# Altium footprint library ERNI THD.PcbLib: 27 footprints (part 1 of 3) (continued)
## ERNI_214363 [mm] "Pre-Alignement Guide Pin With Socket for Coding Keys and Base-Plate, Washer and Nut M4"
height 24
pads (2):
  round 5 / inner round 5 / far side round 8 hole 4.3: 1(0,0)
  round 1 hole 2.5 unplated mask+0.75: MECH(8.5,0)
Top Overlay:
  lines w0.2: -4.5,0 cw(c0,0) -4.229,1.539 ; -4.229,-1.539 ccw(c0,0) -3.447,-2.893 ; -3.447,2.893 cw(c0,0) -2.25,3.897 ; -2.25,-3.897 ccw(c0,0) -0.781,-4.432 ; -0.781,4.432 cw(c0,0) 0.781,4.432 ; 0.781,-4.432 ccw(c0,0) 2.25,-3.897 ; 2.25,3.897 cw(c0,0) 3.447,2.893 ; 3.447,-2.893 ccw(c0,0) 4.229,-1.539 ; 4.229,1.539 cw(c0,0) 4.5,0 ; 6.944,-0.55 5.95,-0.55 5.95,0.55 6.944,0.55 ; -0.995,-4.9 cw(c0,0) -0.995,4.9 0.995,4.9 cw(c0,0) 2.575,4.286 ccw(c3.606,6) 3.606,4 12.45,4 cw(c12.45,3) 13.45,3 13.45,-3 cw(c12.45,-3) 12.45,-4 3.606,-4 ccw(c3.606,-6) 2.575,-4.286 cw(c0,0) 0.995,-4.9 -0.995,-4.9 ; 4.55,-1.125 4.9,-1.731 4.9,-2.925 12.1,-2.925 12.1,-1.731 12.45,-1.125 12.45,1.125 12.1,1.731 12.1,2.925 4.9,2.925 4.9,1.731 4.55,1.125 4.55,-1.125 ; 4.9,-2.825 6.3,-2.825 6.3,-1.6 4.9,-1.6 4.9,-2.825 ; 4.9,1.6 6.3,1.6 6.3,2.825 4.9,2.825 4.9,1.6 ; 10.7,-2.825 12.1,-2.825 12.1,-1.6 10.7,-1.6 10.7,-2.825 ; 10.7,1.6 12.1,1.6 12.1,2.825 10.7,2.825 10.7,1.6
Mechanical 8:
  lines w0.1: -0.5,0 0,0 ; 0,-0.5 0,0 ; 0,0.5 0,0 ; 0.5,0 0,0 ; 8,0 8.5,0 ; 8.5,-0.5 8.5,0 ; 8.5,0.5 8.5,0 ; 9,0 8.5,0 ; 10.5,-4 10.5,0 10.5,4
  text "Comp Side" at 9.825,-4.432 h1
Mechanical 14:
  circle w0.1: c0,0 r3.05
  circle w0.1: c0,0 r2.5
  lines w0.1: -4.5,0 cw(c0,0) -4.229,1.539 ; -4.229,-1.539 ccw(c0,0) -3.447,-2.893 ; -3.447,2.893 cw(c0,0) -2.25,3.897 ; -2.25,-3.897 ccw(c0,0) -0.781,-4.432 ; -0.781,4.432 cw(c0,0) 0.781,4.432 ; 0.781,-4.432 ccw(c0,0) 2.25,-3.897 ; 2.25,3.897 cw(c0,0) 3.447,2.893 ; 3.447,-2.893 ccw(c0,0) 4.229,-1.539 ; 4.229,1.539 cw(c0,0) 4.5,0 ; -2.267,-3.05 cw(c0,0) -2.267,3.05 2.267,3.05 cw(c0,0) 2.267,-3.05 -2.267,-3.05 ; -0.995,-4.9 cw(c0,0) -0.995,4.9 0.995,4.9 cw(c0,0) 2.575,4.286 ccw(c3.606,6) 3.606,4 12.45,4 cw(c12.45,3) 13.45,3 13.45,-3 cw(c12.45,-3) 12.45,-4 3.606,-4 ccw(c3.606,-6) 2.575,-4.286 cw(c0,0) 0.995,-4.9 -0.995,-4.9 ; 4.55,-1.125 4.9,-1.731 4.9,-2.925 12.1,-2.925 12.1,-1.731 12.45,-1.125 12.45,1.125 12.1,1.731 12.1,2.925 4.9,2.925 4.9,1.731 4.55,1.125 4.55,-1.125 ; 4.9,-2.825 6.3,-2.825 6.3,-1.6 4.9,-1.6 4.9,-2.825 ; 4.9,1.6 6.3,1.6 6.3,2.825 4.9,2.825 4.9,1.6 ; 5.95,-0.55 7.05,-0.55 7.05,0.55 5.95,0.55 5.95,-0.55 ; 10.7,-2.825 12.1,-2.825 12.1,-1.6 10.7,-1.6 10.7,-2.825 ; 10.7,1.6 12.1,1.6 12.1,2.825 10.7,2.825 10.7,1.6
3D body "ERNI_214363_Part2.stp": height -1.6, standoff -4.3, extent -3.75,-4.041 3.75,4.042
3D body "ERNI_214363_Part1.stp": height 24, standoff -8, extent -5,-4.9 13.45,4.9

## ERNI_214443 [mm] "40+4 Contacts, 5 Rows  (a,b,c,d,e) of 8 positions + 1 Shield Row (f) of  4 Positions, Pitch 2 mm,  Press-Fit, Right Angle Ermet B8 CompactPCI Express Female Connector"
height 11.4
pads (44):
  round 1.1 hole 0.6: a1(4,7) a2(4,5) a3(4,3) a4(4,1) a5(4,-1) a6(4,-3) a7(4,-5) a8(4,-7) b1(2,7) b2(2,5) b3(2,3) b4(2,1) b5(2,-1) b6(2,-3) b7(2,-5) b8(2,-7) c1(0,7) c2(0,5) c3(0,3) c4(0,1) c5(0,-1) c6(0,-3) c7(0,-5) c8(0,-7) d1(-2,7) d2(-2,5) d3(-2,3) d4(-2,1) d5(-2,-1) d6(-2,-3) d7(-2,-5) d8(-2,-7) e1(-4,7) e2(-4,5) e3(-4,3) e4(-4,1) e5(-4,-1) e6(-4,-3) e7(-4,-5) e8(-4,-7) f1(-6,7) f3(-6,3) f5(-6,-1) f7(-6,-5)
Top Overlay:
  lines w0.2: -6.109,-5.944 -6.109,-7.915 -4.515,-7.915 ; -6.109,-4.056 -6.109,-1.944 ; -6.109,-0.056 -6.109,2.056 ; -6.109,3.944 -6.109,6.056 ; -5.849,-7.915 -5.849,-8 14.801,-8 14.801,8 -5.849,8 -5.849,7.915 ; -5.744,7.915 -4.515,7.915 ; -5.689,-7.915 -5.689,-5.898 ; -5.689,-4.102 -5.689,-1.898 ; -5.689,-0.102 -5.689,2.102 ; -5.689,3.898 -5.689,6.102 ; -5.689,7.898 -5.689,7.915 ; 4.515,-7.915 13.601,-7.915 13.601,-6.365 cw(c13.751,-6.365) 13.738,-6.216 14.218,-6.215 14.218,-5.715 13.751,-5.715 cw(c13.751,-5.565) 13.601,-5.565 13.601,-0.365 cw(c13.751,-0.365) 13.751,-0.215 14.218,-0.215 14.218,0.285 13.751,0.285 cw(c13.751,0.435) 13.601,0.435 13.601,5.635 cw(c13.751,5.635) 13.751,5.785 14.218,5.785 14.218,6.285 13.751,6.285 cw(c13.751,6.435) 13.601,6.435 13.601,7.915 4.515,7.915 ; 8.423,-7.49 ccw(c8.548,-7.49) 8.548,-7.615 12.701,-7.615 ccw(c12.701,-7.215) 13.101,-7.215 13.101,-6.715 ccw(c12.701,-6.715) 12.701,-6.315 8.548,-6.315 ccw(c8.548,-6.44) 8.423,-6.44 8.423,-6.565 12.701,-6.565 12.701,-7.365 8.423,-7.365 8.423,-7.49 ; 8.423,-5.49 ccw(c8.548,-5.49) 8.548,-5.615 12.701,-5.615 ccw(c12.701,-5.215) 13.101,-5.215 13.101,-4.715 ccw(c12.701,-4.715) 12.701,-4.315 8.548,-4.315 ccw(c8.548,-4.44) 8.423,-4.44 8.423,-4.565 12.701,-4.565 12.701,-5.365 8.423,-5.365 8.423,-5.49 ; 8.423,-3.49 ccw(c8.548,-3.49) 8.548,-3.615 12.701,-3.615 ccw(c12.701,-3.215) 13.101,-3.215 13.101,-2.715 ccw(c12.701,-2.715) 12.701,-2.315 8.548,-2.315 ccw(c8.548,-2.44) 8.423,-2.44 8.423,-2.565 12.701,-2.565 12.701,-3.365 8.423,-3.365 8.423,-3.49 ; 8.423,-1.49 ccw(c8.548,-1.49) 8.548,-1.615 12.701,-1.615 ccw(c12.701,-1.215) 13.101,-1.215 13.101,-0.715 ccw(c12.701,-0.715) 12.701,-0.315 8.548,-0.315 ccw(c8.548,-0.44) 8.423,-0.44 8.423,-0.565 12.701,-0.565 12.701,-1.365 8.423,-1.365 8.423,-1.49 ; 8.423,0.51 ccw(c8.548,0.51) 8.548,0.385 12.701,0.385 ccw(c12.701,0.785) 13.101,0.785 13.101,1.285 ccw(c12.701,1.285) 12.701,1.685 8.548,1.685 ccw(c8.548,1.56) 8.423,1.56 8.423,1.435 12.701,1.435 12.701,0.635 8.423,0.635 8.423,0.51 ; 8.423,2.51 ccw(c8.548,2.51) 8.548,2.385 12.701,2.385 ccw(c12.701,2.785) 13.101,2.785 13.101,3.285 ccw(c12.701,3.285) 12.701,3.685 8.548,3.685 ccw(c8.548,3.56) 8.423,3.56 8.423,3.435 12.701,3.435 12.701,2.635 8.423,2.635 8.423,2.51 ; 8.423,4.51 ccw(c8.548,4.51) 8.548,4.385 12.701,4.385 ccw(c12.701,4.785) 13.101,4.785 13.101,5.285 ccw(c12.701,5.285) 12.701,5.685 8.548,5.685 ccw(c8.548,5.56) 8.423,5.56 8.423,5.435 12.701,5.435 12.701,4.635 8.423,4.635 8.423,4.51 ; 8.423,6.51 ccw(c8.548,6.51) 8.548,6.385 12.701,6.385 ccw(c12.701,6.785) 13.101,6.785 13.101,7.285 ccw(c12.701,7.285) 12.701,7.685 8.548,7.685 ccw(c8.548,7.56) 8.423,7.56 8.423,7.435 12.701,7.435 12.701,6.635 8.423,6.635 8.423,6.51
  text "8" at -7.95,-7.6 h1.2
  text "1" at -7.475,6.35 h1.2
Mechanical 8:
  drawing of 180 lines, arcs and shapes, not listed
  text "PCB EDGE" at 7.03,-4.575 h1.2
Mechanical 14:
  lines w0.1: -5.849,-7.915 -5.849,-8 14.801,-8 14.801,8 -5.849,8 -5.849,7.915 ; -5.689,-7.915 -5.689,7.915 ; -6.109,-7.915 13.601,-7.915 13.601,-6.365 cw(c13.751,-6.365) 13.738,-6.216 14.218,-6.215 14.218,-5.715 13.751,-5.715 cw(c13.751,-5.565) 13.601,-5.565 13.601,-0.365 cw(c13.751,-0.365) 13.751,-0.215 14.218,-0.215 14.218,0.285 13.751,0.285 cw(c13.751,0.435) 13.601,0.435 13.601,5.635 cw(c13.751,5.635) 13.751,5.785 14.218,5.785 14.218,6.285 13.751,6.285 cw(c13.751,6.435) 13.601,6.435 13.601,7.915 -6.109,7.915 -6.109,-7.915 ; 8.423,-7.49 ccw(c8.548,-7.49) 8.548,-7.615 12.701,-7.615 ccw(c12.701,-7.215) 13.101,-7.215 13.101,-6.715 ccw(c12.701,-6.715) 12.701,-6.315 8.548,-6.315 ccw(c8.548,-6.44) 8.423,-6.44 8.423,-6.565 12.701,-6.565 12.701,-7.365 8.423,-7.365 8.423,-7.49 ; 8.423,-5.49 ccw(c8.548,-5.49) 8.548,-5.615 12.701,-5.615 ccw(c12.701,-5.215) 13.101,-5.215 13.101,-4.715 ccw(c12.701,-4.715) 12.701,-4.315 8.548,-4.315 ccw(c8.548,-4.44) 8.423,-4.44 8.423,-4.565 12.701,-4.565 12.701,-5.365 8.423,-5.365 8.423,-5.49 ; 8.423,-3.49 ccw(c8.548,-3.49) 8.548,-3.615 12.701,-3.615 ccw(c12.701,-3.215) 13.101,-3.215 13.101,-2.715 ccw(c12.701,-2.715) 12.701,-2.315 8.548,-2.315 ccw(c8.548,-2.44) 8.423,-2.44 8.423,-2.565 12.701,-2.565 12.701,-3.365 8.423,-3.365 8.423,-3.49 ; 8.423,-1.49 ccw(c8.548,-1.49) 8.548,-1.615 12.701,-1.615 ccw(c12.701,-1.215) 13.101,-1.215 13.101,-0.715 ccw(c12.701,-0.715) 12.701,-0.315 8.548,-0.315 ccw(c8.548,-0.44) 8.423,-0.44 8.423,-0.565 12.701,-0.565 12.701,-1.365 8.423,-1.365 8.423,-1.49 ; 8.423,0.51 ccw(c8.548,0.51) 8.548,0.385 12.701,0.385 ccw(c12.701,0.785) 13.101,0.785 13.101,1.285 ccw(c12.701,1.285) 12.701,1.685 8.548,1.685 ccw(c8.548,1.56) 8.423,1.56 8.423,1.435 12.701,1.435 12.701,0.635 8.423,0.635 8.423,0.51 ; 8.423,2.51 ccw(c8.548,2.51) 8.548,2.385 12.701,2.385 ccw(c12.701,2.785) 13.101,2.785 13.101,3.285 ccw(c12.701,3.285) 12.701,3.685 8.548,3.685 ccw(c8.548,3.56) 8.423,3.56 8.423,3.435 12.701,3.435 12.701,2.635 8.423,2.635 8.423,2.51 ; 8.423,4.51 ccw(c8.548,4.51) 8.548,4.385 12.701,4.385 ccw(c12.701,4.785) 13.101,4.785 13.101,5.285 ccw(c12.701,5.285) 12.701,5.685 8.548,5.685 ccw(c8.548,5.56) 8.423,5.56 8.423,5.435 12.701,5.435 12.701,4.635 8.423,4.635 8.423,4.51 ; 8.423,6.51 ccw(c8.548,6.51) 8.548,6.385 12.701,6.385 ccw(c12.701,6.785) 13.101,6.785 13.101,7.285 ccw(c12.701,7.285) 12.701,7.685 8.548,7.685 ccw(c8.548,7.56) 8.423,7.56 8.423,7.435 12.701,7.435 12.701,6.635 8.423,6.635 8.423,6.51
  text "8" at -7.95,-7.6 h1.2
  text "1" at -7.475,6.35 h1.2
Drill Drawing:
  lines w0.1: -6.975,-8 4.9,-8 4.9,8 -6.975,8 -6.975,-8
  text "diam. 0.6mm +/-0.05" at 8.175,-8.15 h1
  text "PRESS-FIT TECHNOLOGY" at 6.575,-8.45 h1
3D body "ERNI_214443.stp": height 8.09, standoff -3.7, extent -6.109,-8.8 14.801,8

## ERNI_233230 [mm] "DIN 41612, Type H, 11 Positions, Right Angle Male Connector, Pitch 7.62 mm, With Early Make Last Break Contacts"
height 11.1
pads (13):
  round 2.3 hole 1.6: 2(0,0) 5(0,-7.62) 8(0,-15.24) 11(0,-22.86) 14(0,-30.48) 17(0,-38.1) 20(0,-45.72) 23(0,-53.34) 26(0,-60.96) 29(0,-68.58) 32(0,-76.2)
  round 3.5 / inner round 3.5 / far side round 5.1 hole 2.8: MTG1(12.7,7.62) MTG2(12.7,-81.28)
Top Overlay:
  lines w0.2: 10.3,-82.568 10.3,-83.83 17.6,-83.83 17.6,-80.83 27,-80.83 27,7.17 17.6,7.17 17.6,10.17 10.3,10.17 10.3,8.907 ; 10.3,-80.043 10.3,-78.78 ; 10.3,5.12 10.3,6.382 ; 11.5,-78.78 -1.6,-78.78 -1.6,5.12 11.5,5.12 ; 14,-78.78 15.7,-78.78 15.7,-83.83 ; 14,5.12 15.7,5.12 15.7,10.17 ; 27,-66.1 25.3,-66.1 25.3,-65.05 27,-65.05 ; 27,-61.95 25.3,-61.95 25.3,-60.9 27,-60.9 ; 27,-50.86 25.3,-50.86 25.3,-49.81 27,-49.81 ; 27,-46.71 25.3,-46.71 25.3,-45.66 27,-45.66 ; 27,-35.62 25.3,-35.62 25.3,-34.57 27,-34.57 ; 27,-31.47 25.3,-31.47 25.3,-30.42 27,-30.42 ; 27,-20.38 25.3,-20.38 25.3,-19.33 27,-19.33 ; 27,-16.23 25.3,-16.23 25.3,-15.18 27,-15.18
  text "2" at -3.145,-0.635 h1.2
  text "5" at -3.145,-8.255 h1.2
  text "8" at -3.145,-15.875 h1.2
  text "11" at -3.78,-23.495 h1.2
  text "14" at -3.78,-31.115 h1.2
  text "17" at -3.78,-38.735 h1.2
  text "20" at -3.78,-46.355 h1.2
  text "23" at -3.78,-53.975 h1.2
  text "26" at -3.78,-61.595 h1.2
  text "29" at -3.78,-69.215 h1.2
  text "32" at -3.78,-76.835 h1.2
Mechanical 8:
  circle w0.2: c0,0 r0.8
  circle w0.2: c0,-7.62 r0.8
  circle w0.2: c0,-15.24 r0.8
  circle w0.2: c0,-22.86 r0.8
  circle w0.2: c0,-30.48 r0.8
  circle w0.2: c0,-38.1 r0.8
  circle w0.2: c0,-45.72 r0.8
  circle w0.2: c0,-53.34 r0.8
  circle w0.2: c12.7,7.62 r1.4
  circle w0.2: c0,-60.96 r0.8
  circle w0.2: c0,-68.58 r0.8
  circle w0.2: c12.7,-81.28 r1.4
  circle w0.2: c0,-76.2 r0.8
  lines w0.2: 0,-77.4 0,-76.2 1.2,-76.2 ; 0,-69.78 0,-68.58 1.2,-68.58 ; 0,-62.16 0,-60.96 1.2,-60.96 ; 0,-54.54 0,-53.34 1.2,-53.34 ; 0,-46.92 0,-45.72 1.2,-45.72 ; 0,-39.3 0,-38.1 1.2,-38.1 ; 0,-31.68 0,-30.48 1.2,-30.48 ; 0,-24.06 0,-22.86 1.2,-22.86 ; 0,-16.44 0,-15.24 1.2,-15.24 ; 0,-8.82 0,-7.62 1.2,-7.62 ; 0,-1.2 0,0 1.2,0 ; 10.795,-36.83 12.7,-36.83 12.7,-38.735 ; 12.7,-83.38 12.7,-81.28 14.8,-81.28 ; 12.7,5.52 12.7,7.62 14.8,7.62 ; 15,-83.83 15,-40.005 ; 15,-33.655 15,10.17
  text "PCB" at 15.875,-38.735 h1.5
Mechanical 14:
  lines w0.1: 10.3,-78.78 10.3,-83.83 17.6,-83.83 17.6,-80.83 27,-80.83 27,7.17 17.6,7.17 17.6,10.17 10.3,10.17 10.3,5.12 ; 15.7,-83.83 15.7,-78.78 -1.6,-78.78 -1.6,5.12 15.7,5.12 15.7,10.17 ; 27,-66.1 25.3,-66.1 25.3,-65.05 27,-65.05 ; 27,-61.95 25.3,-61.95 25.3,-60.9 27,-60.9 ; 27,-50.86 25.3,-50.86 25.3,-49.81 27,-49.81 ; 27,-46.71 25.3,-46.71 25.3,-45.66 27,-45.66 ; 27,-35.62 25.3,-35.62 25.3,-34.57 27,-34.57 ; 27,-31.47 25.3,-31.47 25.3,-30.42 27,-30.42 ; 27,-20.38 25.3,-20.38 25.3,-19.33 27,-19.33 ; 27,-16.23 25.3,-16.23 25.3,-15.18 27,-15.18
3D body "ERNI_233230.stp": height 9.5, standoff -3.5, extent -1.6,-83.83 27,10.17

## ERNI_234675 [mm] "Pre-Alignement Guide Bush With Electrical Contact, Screw M4x6 with Thread Locker"
height 15.4
pads (3):
  round 5.2 / inner round 5.2 / far side round 8 hole 4.5: 1(0,0)
  round 1 hole 3.1 unplated mask+1.05: MECH(-7,0) MECH(7,0)
Top Layer keep-out:
  lines w0.1: -10,-4.95 9,-4.95 9,4.95 -10,4.95 -10,-4.95
Top Overlay:
  lines w0.2: -18.2,-4.9 -18.2,4.9 ; -9,-4.05 -9,-4.95 9,-4.95 9,4.95 -9,4.95 -9,4.05 ; -4.5,0 cw(c0,0) -4.229,1.539 ; -4.229,-1.539 ccw(c0,0) -3.447,-2.893 ; -3.447,2.893 cw(c0,0) -2.25,3.897 ; -2.25,-3.897 ccw(c0,0) -0.781,-4.432 ; -0.781,4.432 cw(c0,0) 0.781,4.432 ; 0.781,-4.432 ccw(c0,0) 2.25,-3.897 ; 1,-3.05 9,-3.05 ; 1,-2.775 1,-4.05 -16.7,-4.05 ; 1,2.775 1,4.05 -16.7,4.05 ; 1,3.05 9,3.05 ; 2.25,3.897 cw(c0,0) 3.447,2.893 ; 3.447,-2.893 ccw(c0,0) 4.229,-1.539 ; 4.229,1.539 cw(c0,0) 4.5,0 ; 4.3,-3.05 4.3,3.05 ; -18.2,4.9 -16.7,4.05 ; -18.2,4.9 -19.7,4.9 -19.7,-4.9 -18.2,-4.916 -16.7,-4.05 ; -16.7,-4.05 -16.7,4.05
Mechanical 8:
  circle w0.1: c0,0 r2.25
  circle w0.1: c7,0 r1.55
  circle w0.1: c-7,0 r1.55
  lines w0.1: -22.4,-4.95 -22.4,0 -22.4,4.95 ; -10,-4.95 -10,0 -10,4.95 ; -7.5,0 -7,0 ; -7,-0.5 -7,0 ; -7,0.5 -7,0 ; -6.5,0 -7,0 ; -0.5,0 0,0 ; 0,-0.5 0,0 ; 0,0.5 0,0 ; 0.5,0 0,0 ; 6.5,0 7,0 ; 7,-0.5 7,0 ; 7,0.5 7,0 ; 7.5,0 7,0
  text "Backplane" at -23.025,-4.25 h1
  text "PCB" at -10.425,-1.325 h1
Mechanical 14:
  lines w0.1: -18.2,-4.9 -18.2,4.9 ; -9,-4.05 -9,-4.95 9,-4.95 9,4.95 -9,4.95 -9,4.05 ; -4.5,0 cw(c0,0) -4.229,1.539 ; -4.229,-1.539 ccw(c0,0) -3.447,-2.893 ; -3.447,2.893 cw(c0,0) -2.25,3.897 ; -2.25,-3.897 ccw(c0,0) -0.781,-4.432 ; -0.781,4.432 cw(c0,0) 0.781,4.432 ; 0.781,-4.432 ccw(c0,0) 2.25,-3.897 ; 1,-3.05 9,-3.05 ; 1,-1.249 ccw(c0,0) 1,1.249 ; 1,3.05 9,3.05 ; 2.25,3.897 cw(c0,0) 3.447,2.893 ; 3.447,-2.893 ccw(c0,0) 4.229,-1.539 ; 4.229,1.539 cw(c0,0) 4.5,0 ; 4.3,-3.05 4.3,3.05 ; -18.2,4.9 -16.7,4.05 ; -18.2,4.9 -19.7,4.9 -19.7,-4.9 -18.2,-4.916 -16.7,-4.05 ; -16.7,-4.05 -16.7,4.05 ; -16.7,-4.05 1,-4.05 1,4.05 -16.7,4.05
3D body "ERNI_234675_Part1.stp": height 15.32, standoff -3.3, extent -19.7,-4.95 9,4.95
3D body "ERNI_234675_Part2.stp": height 4.4, standoff -4.7, extent -4,-4 4,4

## ERNI_254006 [mm] "DIN 41612, Type E, 160 Positions, Rows a+b+c+d+e, Class 2, Vertical Female Connector, Press-Fit, Lead 5.5mm, Pitch 2.54mm"
height 11.6
pads (162):
  round 1.7 hole 1: a1(0,0) a2(0,-2.54) a3(0,-5.08) a4(0,-7.62) a5(0,-10.16) a6(0,-12.7) a7(0,-15.24) a8(0,-17.78) a9(0,-20.32) a10(0,-22.86) a11(0,-25.4) a12(0,-27.94) a13(0,-30.48) a14(0,-33.02) a15(0,-35.56) a16(0,-38.1) a17(0,-40.64) a18(0,-43.18) a19(0,-45.72) a20(0,-48.26) a21(0,-50.8) a22(0,-53.34) a23(0,-55.88) a24(0,-58.42) a25(0,-60.96) a26(0,-63.5) a27(0,-66.04) a28(0,-68.58) a29(0,-71.12) a30(0,-73.66) a31(0,-76.2) a32(0,-78.74) b1(2.54,0) b2(2.54,-2.54) b3(2.54,-5.08) b4(2.54,-7.62) b5(2.54,-10.16) b6(2.54,-12.7) b7(2.54,-15.24) b8(2.54,-17.78) b9(2.54,-20.32) b10(2.54,-22.86) b11(2.54,-25.4) b12(2.54,-27.94) b13(2.54,-30.48) b14(2.54,-33.02) b15(2.54,-35.56) b16(2.54,-38.1) b17(2.54,-40.64) b18(2.54,-43.18) b19(2.54,-45.72) b20(2.54,-48.26) b21(2.54,-50.8) b22(2.54,-53.34) b23(2.54,-55.88) b24(2.54,-58.42) b25(2.54,-60.96) b26(2.54,-63.5) b27(2.54,-66.04) b28(2.54,-68.58) b29(2.54,-71.12) b30(2.54,-73.66) b31(2.54,-76.2) b32(2.54,-78.74) c1(5.08,0) c2(5.08,-2.54) c3(5.08,-5.08) c4(5.08,-7.62) c5(5.08,-10.16) c6(5.08,-12.7) c7(5.08,-15.24) c8(5.08,-17.78) c9(5.08,-20.32) c10(5.08,-22.86) c11(5.08,-25.4) c12(5.08,-27.94) c13(5.08,-30.48) c14(5.08,-33.02) c15(5.08,-35.56) c16(5.08,-38.1) c17(5.08,-40.64) c18(5.08,-43.18) c19(5.08,-45.72) c20(5.08,-48.26) c21(5.08,-50.8) c22(5.08,-53.34) c23(5.08,-55.88) c24(5.08,-58.42) c25(5.08,-60.96) c26(5.08,-63.5) c27(5.08,-66.04) c28(5.08,-68.58) c29(5.08,-71.12) c30(5.08,-73.66) c31(5.08,-76.2) c32(5.08,-78.74) d1(7.62,0) d2(7.62,-2.54) d3(7.62,-5.08) d4(7.62,-7.62) d5(7.62,-10.16) d6(7.62,-12.7) d7(7.62,-15.24) d8(7.62,-17.78) d9(7.62,-20.32) d10(7.62,-22.86) d11(7.62,-25.4) d12(7.62,-27.94) d13(7.62,-30.48) d14(7.62,-33.02) d15(7.62,-35.56) d16(7.62,-38.1) d17(7.62,-40.64) d18(7.62,-43.18) d19(7.62,-45.72) d20(7.62,-48.26) d21(7.62,-50.8) d22(7.62,-53.34) d23(7.62,-55.88) d24(7.62,-58.42) d25(7.62,-60.96) d26(7.62,-63.5) d27(7.62,-66.04) d28(7.62,-68.58) d29(7.62,-71.12) d30(7.62,-73.66) d31(7.62,-76.2) d32(7.62,-78.74) e1(10.16,0) e2(10.16,-2.54) e3(10.16,-5.08) e4(10.16,-7.62) e5(10.16,-10.16) e6(10.16,-12.7) e7(10.16,-15.24) e8(10.16,-17.78) e9(10.16,-20.32) e10(10.16,-22.86) e11(10.16,-25.4) e12(10.16,-27.94) e13(10.16,-30.48) e14(10.16,-33.02) e15(10.16,-35.56) e16(10.16,-38.1) e17(10.16,-40.64) e18(10.16,-43.18) e19(10.16,-45.72) e20(10.16,-48.26) e21(10.16,-50.8) e22(10.16,-53.34) e23(10.16,-55.88) e24(10.16,-58.42) e25(10.16,-60.96) e26(10.16,-63.5) e27(10.16,-66.04) e28(10.16,-68.58) e29(10.16,-71.12) e30(10.16,-73.66) e31(10.16,-76.2) e32(10.16,-78.74)
  round 3.5 / inner round 3.5 / far side round 5.1 hole 2.8: MTG1(2.24,5.63) MTG2(2.24,-84.37)
Top Overlay:
  drawing of 319 lines, arcs and shapes, not listed
  text "5" at -4.127,-10.535 h1
  text "10" at -4.763,-23.235 h1
  text "30" at -5.08,-74.035 h1
  text "25" at -5.08,-61.335 h1
  text "20" at -5.08,-48.635 h1
  text "15" at -5.08,-35.935 h1
  text "1" at -3.81,-0.375 h1
  text "32" at -5.08,-79.115 h1
  text "a" at -0.318,1.429 h1
  text "c" at 4.763,1.429 h1
  text "b" at 2.24,1.429 h1
  text "d" at 7.302,1.429 h1
  text "e" at 10.16,2.54 h1
Mechanical 8:
  drawing of 312 lines, arcs and shapes, not listed
Mechanical 14:
  drawing of 2248 lines, arcs and shapes, not listed
  text "e" at 10.16,2.54 h1
  text "d" at 7.302,1.429 h1
  text "b" at 2.24,1.429 h1
  text "c" at 4.763,1.429 h1
  text "a" at -0.318,1.429 h1
  text "32" at -1.385,-79.534 h1
  text "1" at -1.385,-0.159 h1
Drill Drawing:
  lines w0.1: -2.54,-58.42 -2.54,-81.28 12.7,-81.28 12.7,2.54 -2.54,2.54 -2.54,-20.32
  text "PRESS-FIT TECHNOLOGY diam. 1mm +0.09 -0.06" at -1.905,-57.15 h1
3D body "ERNI_254006.stp": height 11.45, standoff -5.5, extent -2.71,-86.795 12.87,8.055

## ERNI_254320 [mm] "Connector; DIN 41612, Type C/3, Thru-Hole; Rows a+b+c, 30 Female Contacts"
height 11.6
pads (32):
  round 1.5 hole 1: a1(0,0) a2(0,-2.54) a3(0,-5.08) a4(0,-7.62) a5(0,-10.16) a6(0,-12.7) a7(0,-15.24) a8(0,-17.78) a9(0,-20.32) a10(0,-22.86) b1(2.54,0) b2(2.54,-2.54) b3(2.54,-5.08) b4(2.54,-7.62) b5(2.54,-10.16) b6(2.54,-12.7) b7(2.54,-15.24) b8(2.54,-17.78) b9(2.54,-20.32) b10(2.54,-22.86) c1(5.08,0) c2(5.08,-2.54) c3(5.08,-5.08) c4(5.08,-7.62) c5(5.08,-10.16) c6(5.08,-12.7) c7(5.08,-15.24) c8(5.08,-17.78) c9(5.08,-20.32) c10(5.08,-22.86)
  round 3.5 / inner round 3.5 / far side round 5.1 hole 2.8: MTG1(2.24,5.95) MTG2(2.24,-28.81)
Top Overlay:
  lines w0.2: -2.71,-29.139 -2.71,-28.996 -2.71,-28.643 -2.71,-28.5 ; -1.597,-25.872 -1.035,-25.31 ; -1.597,3.012 -1.035,2.45 ; -1.035,-23.6 -1.035,-25.31 ; -1.035,0.74 -1.035,2.45 ; -0.76,-31.23 -0.76,-26.96 cw(c0.24,-26.96) 0.24,-25.96 ; -0.76,8.37 -0.76,4.1 ccw(c0.24,4.1) 0.24,3.1 ; -0.485,-25.31 -1.035,-25.31 ; -0.485,2.45 -1.035,2.45 ; 1.08,-31.23 -2.41,-31.23 cw(c-2.41,-30.93) -2.71,-30.93 -2.71,8.07 cw(c-2.41,8.07) -2.41,8.37 1.08,8.37 ; 2.665,-25.96 2.665,-24.96 -0.485,-24.96 -0.485,-25.96 ; 2.665,-25.31 3.215,-25.31 ; 2.665,2.45 3.215,2.45 ; 2.665,3.1 2.665,2.1 -0.485,2.1 -0.485,3.1 ; 3.565,-25.96 ccw(c3.565,-25.66) 3.865,-25.66 3.865,-24.91 ; 3.565,3.1 cw(c3.565,2.8) 3.865,2.8 3.865,2.05 ; 3.777,-25.872 3.215,-25.31 ; 3.777,3.012 3.215,2.45 ; 4,-31.23 7.49,-31.23 ccw(c7.49,-30.93) 7.79,-30.93 7.79,8.07 ccw(c7.49,8.07) 7.49,8.37 4,8.37 ; 5.24,-31.23 5.24,-26.96 ccw(c4.24,-26.96) 4.24,-25.96 0.24,-25.96 ; 5.24,8.37 5.24,4.1 cw(c4.24,4.1) 4.24,3.1 0.24,3.1 ; 6.115,-23.425 6.115,-24.26 ; 6.115,0.565 6.115,1.4 ; 6.677,-24.822 6.115,-24.26 ; 6.677,1.962 6.115,1.4 ; 7.79,-29.139 7.79,-28.643 ; 7.79,5.64 7.79,5.783 ; -0.485,-25.96 -1.385,-25.96 cw(c-1.385,-25.66) -1.685,-25.66 -1.685,-22.11 -1.685,-0.75 -1.685,2.8 cw(c-1.385,2.8) -1.385,3.1 -0.485,3.1 ; -0.485,-25.96 0.24,-25.96 ; -0.485,3.1 0.24,3.1 ; 3.215,-25.31 3.215,-24.26 ; 3.215,-24.26 3.865,-24.91 ; 3.215,-24.26 6.115,-24.26 ; 3.215,1.4 3.865,2.05 ; 3.215,1.4 3.215,2.45 ; 3.215,1.4 6.115,1.4 ; 3.865,-24.91 6.465,-24.91 ccw(c6.465,-24.61) 6.765,-24.61 6.765,-22.11 6.765,-0.75 6.765,1.75 ccw(c6.465,1.75) 6.465,2.05 3.865,2.05
  text "10" at -4.918,-23.535 h1.2
  text "5" at -3.92,-10.885 h1.2
  text "1" at -3.585,-0.725 h1.2
  text "a" at -2.186,3.81 h1.2
  text "c" at 5.915,3.81 h1.2
Mechanical 8:
  lines w0.1: -1,-22.86 0,-22.86 ; -1,-20.32 0,-20.32 ; -1,-17.78 0,-17.78 ; -1,-15.24 0,-15.24 ; -1,-12.7 0,-12.7 ; -1,-10.16 0,-10.16 ; -1,-7.62 0,-7.62 ; -1,-5.08 0,-5.08 ; -1,-2.54 0,-2.54 ; -1,0 0,0 ; 0,-23.86 0,-22.86 ; 0,-21.86 0,-22.86 ; 0,-21.32 0,-20.32 ; 0,-19.32 0,-20.32 ; 0,-18.78 0,-17.78 ; 0,-16.78 0,-17.78 ; 0,-16.24 0,-15.24 ; 0,-14.24 0,-15.24 ; 0,-13.7 0,-12.7 ; 0,-11.7 0,-12.7 ; 0,-11.16 0,-10.16 ; 0,-9.16 0,-10.16 ; 0,-8.62 0,-7.62 ; 0,-6.62 0,-7.62 ; 0,-6.08 0,-5.08 ; 0,-4.08 0,-5.08 ; 0,-3.54 0,-2.54 ; 0,-1.54 0,-2.54 ; 0,-1 0,0 ; 0,1 0,0 ; 1,-22.86 0,-22.86 ; 1,-20.32 0,-20.32 ; 1,-17.78 0,-17.78 ; 1,-15.24 0,-15.24 ; 1,-12.7 0,-12.7 ; 1,-10.16 0,-10.16 ; 1,-7.62 0,-7.62 ; 1,-5.08 0,-5.08 ; 1,-2.54 0,-2.54 ; 1,0 0,0 ; 1.24,-28.81 2.24,-28.81 ; 1.24,5.95 2.24,5.95 ; 1.54,-22.86 2.54,-22.86 ; 1.54,-20.32 2.54,-20.32 ; 1.54,-17.78 2.54,-17.78 ; 1.54,-15.24 2.54,-15.24 ; 1.54,-12.7 2.54,-12.7 ; 1.54,-10.16 2.54,-10.16 ; 1.54,-7.62 2.54,-7.62 ; 1.54,-5.08 2.54,-5.08 ; 1.54,-2.54 2.54,-2.54 ; 1.54,0 2.54,0 ; 2.24,-29.81 2.24,-28.81 ; 2.24,-27.81 2.24,-28.81 ; 2.24,4.95 2.24,5.95 ; 2.24,6.95 2.24,5.95 ; 2.54,-23.86 2.54,-22.86 ; 2.54,-21.86 2.54,-22.86 ; 2.54,-21.32 2.54,-20.32 ; 2.54,-19.32 2.54,-20.32 ; 2.54,-18.78 2.54,-17.78 ; 2.54,-16.78 2.54,-17.78 ; 2.54,-16.24 2.54,-15.24 ; 2.54,-14.24 2.54,-15.24 ; 2.54,-13.7 2.54,-12.7 ; 2.54,-11.7 2.54,-12.7 ; 2.54,-11.16 2.54,-10.16 ; 2.54,-9.16 2.54,-10.16 ; 2.54,-8.62 2.54,-7.62 ; 2.54,-6.62 2.54,-7.62 ; 2.54,-6.08 2.54,-5.08 ; 2.54,-4.08 2.54,-5.08 ; 2.54,-3.54 2.54,-2.54 ; 2.54,-1.54 2.54,-2.54 ; 2.54,-1 2.54,0 ; 2.54,1 2.54,0 ; 3.24,-28.81 2.24,-28.81 ; 3.24,5.95 2.24,5.95 ; 3.54,-22.86 2.54,-22.86 ; 3.54,-20.32 2.54,-20.32 ; 3.54,-17.78 2.54,-17.78 ; 3.54,-15.24 2.54,-15.24 ; 3.54,-12.7 2.54,-12.7 ; 3.54,-10.16 2.54,-10.16 ; 3.54,-7.62 2.54,-7.62 ; 3.54,-5.08 2.54,-5.08 ; 3.54,-2.54 2.54,-2.54 ; 3.54,0 2.54,0 ; 4.08,-22.86 5.08,-22.86 ; 4.08,-20.32 5.08,-20.32 ; 4.08,-17.78 5.08,-17.78 ; 4.08,-15.24 5.08,-15.24 ; 4.08,-12.7 5.08,-12.7 ; 4.08,-10.16 5.08,-10.16 ; 4.08,-7.64 5.08,-7.64 ; 4.08,-5.08 5.08,-5.08 ; 4.08,-2.54 5.08,-2.54 ; 4.08,0 5.08,0 ; 5.08,-23.86 5.08,-22.86 ; 5.08,-21.86 5.08,-22.86 ; 5.08,-21.32 5.08,-20.32 ; 5.08,-19.32 5.08,-20.32 ; 5.08,-18.78 5.08,-17.78 ; 5.08,-16.78 5.08,-17.78 ; 5.08,-16.24 5.08,-15.24 ; 5.08,-14.24 5.08,-15.24 ; 5.08,-13.7 5.08,-12.7 ; 5.08,-11.7 5.08,-12.7 ; 5.08,-11.16 5.08,-10.16 ; 5.08,-9.16 5.08,-10.16 ; 5.08,-8.64 5.08,-7.64 ; 5.08,-6.64 5.08,-7.64 ; 5.08,-6.08 5.08,-5.08 ; 5.08,-4.08 5.08,-5.08 ; 5.08,-3.54 5.08,-2.54 ; 5.08,-1.54 5.08,-2.54 ; 5.08,-1 5.08,0 ; 5.08,1 5.08,0 ; 6.08,-22.86 5.08,-22.86 ; 6.08,-20.32 5.08,-20.32 ; 6.08,-17.78 5.08,-17.78 ; 6.08,-15.24 5.08,-15.24 ; 6.08,-12.7 5.08,-12.7 ; 6.08,-10.16 5.08,-10.16 ; 6.08,-7.64 5.08,-7.64 ; 6.08,-5.08 5.08,-5.08 ; 6.08,-2.54 5.08,-2.54 ; 6.08,0 5.08,0
Mechanical 14:
  circle w0.1: c2.24,-28.81 r1.425
  circle w0.1: c2.24,5.95 r1.425
  lines w0.1: -2.71,-29.139 -2.71,-28.996 -2.71,-28.643 -2.71,-28.5 ; -1.597,-25.872 -1.035,-25.31 ; -1.597,3.012 -1.035,2.45 ; -0.76,-31.23 -0.76,-26.96 cw(c0.24,-26.96) 0.24,-25.96 ; -0.76,8.37 -0.76,4.1 ccw(c0.24,4.1) 0.24,3.1 ; -0.485,-25.31 -1.035,-25.31 ; -0.485,2.45 -1.035,2.45 ; 0.065,-28.81 4.415,-28.81 ; 0.065,5.95 4.415,5.95 ; 2.24,-30.985 2.24,-26.635 ; 2.24,3.775 2.24,8.125 ; 2.665,-25.96 2.665,-24.96 -0.485,-24.96 -0.485,-25.96 ; 2.665,-25.31 3.215,-25.31 ; 2.665,2.45 3.215,2.45 ; 2.665,3.1 2.665,2.1 -0.485,2.1 -0.485,3.1 ; 3.565,-25.96 ccw(c3.565,-25.66) 3.865,-25.66 3.865,-24.91 ; 3.565,3.1 cw(c3.565,2.8) 3.865,2.8 3.865,2.05 ; 3.777,-25.872 3.215,-25.31 ; 3.777,3.012 3.215,2.45 ; 5.24,-31.23 5.24,-26.96 ccw(c4.24,-26.96) 4.24,-25.96 0.24,-25.96 ; 5.24,8.37 5.24,4.1 cw(c4.24,4.1) 4.24,3.1 0.24,3.1 ; 6.677,-24.822 6.115,-24.26 ; 6.677,1.962 6.115,1.4 ; 7.79,-29.139 7.79,-28.643 ; 7.79,5.64 7.79,5.783 ; -1.035,-25.31 -1.035,2.45 ; -0.485,-25.96 -1.385,-25.96 cw(c-1.385,-25.66) -1.685,-25.66 -1.685,-22.11 -1.685,-0.75 -1.685,2.8 cw(c-1.385,2.8) -1.385,3.1 -0.485,3.1 ; -0.485,-25.96 0.24,-25.96 ; -0.485,3.1 0.24,3.1 ; 3.215,-25.31 3.215,-24.26 ; 3.215,-24.26 3.865,-24.91 ; 3.215,-24.26 6.115,-24.26 ; 3.215,1.4 3.865,2.05 ; 3.215,1.4 3.215,2.45 ; 3.215,1.4 6.115,1.4 ; 3.865,-24.91 6.465,-24.91 ccw(c6.465,-24.61) 6.765,-24.61 6.765,-22.11 6.765,-0.75 6.765,1.75 ccw(c6.465,1.75) 6.465,2.05 3.865,2.05 ; 6.115,-24.26 6.115,1.4 ; -2.71,-30.93 ccw(c-2.41,-30.93) -2.41,-31.23 7.49,-31.23 ccw(c7.49,-30.93) 7.79,-30.93 7.79,8.07 ccw(c7.49,8.07) 7.49,8.37 -2.41,8.37 ccw(c-2.41,8.07) -2.71,8.07 -2.71,-30.93
  text "5" at -3.92,-10.885 h1.2
  text "1" at -3.585,-0.725 h1.2
  text "10" at -4.918,-23.535 h1.2
  text "a" at -2.186,3.81 h1.2
  text "c" at 5.915,3.81 h1.2
3D body "ERNI_254320.stp": height 11.6, standoff -4.5, extent -2.71,-31.23 7.79,8.37